# Altium footprint library smdComponent.PcbLib: 182 footprints (part 10 of 12)
Each footprint in its own frame and in the unit in brackets; x right, y up, seen from the top. Pads: shape width x height; smd on the part's side, far side on the other; paste and mask are expansions set on the pad; w line width, h text height; cw(c..) or ccw(c..) is an arc to the next point about the centre after c.
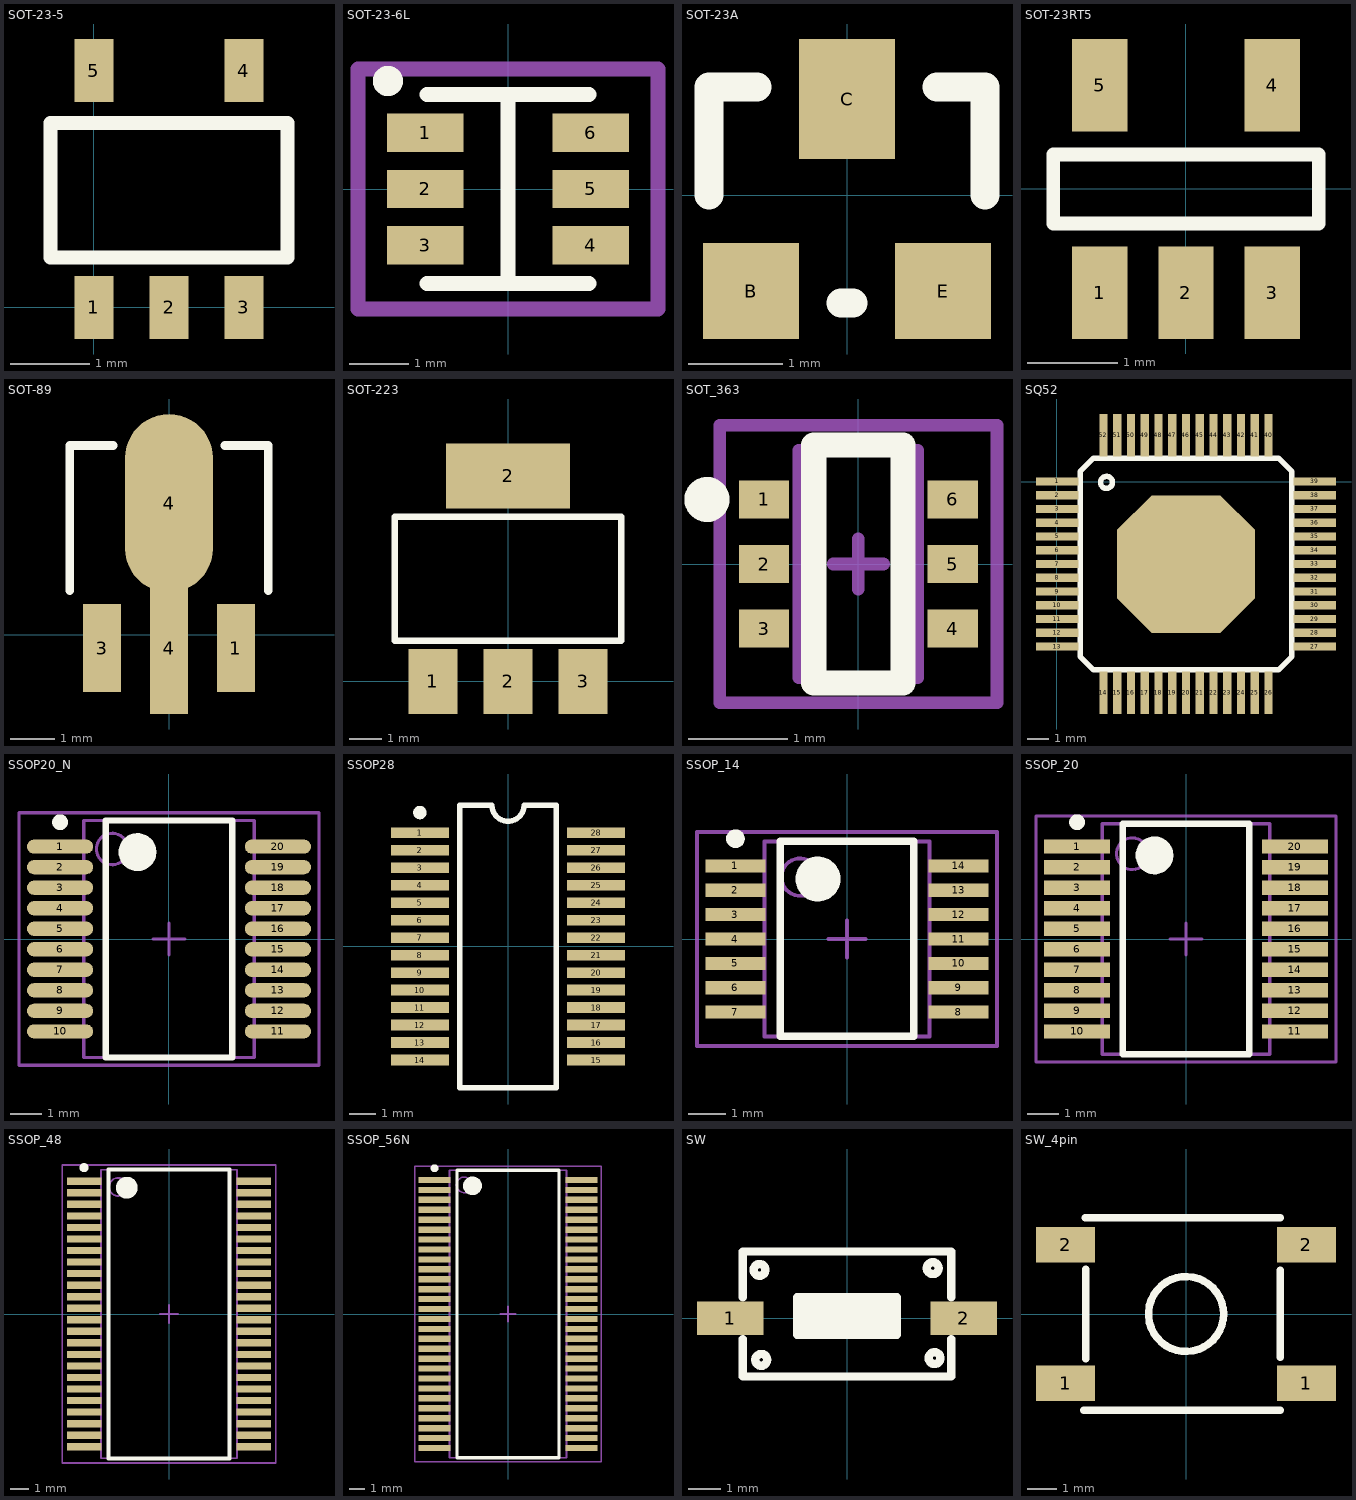
[diagram p9: the footprints below, top view; thin cyan lines are the x and y axes]

## SOT-23-5 [mm] "big num"
pads (5):
  rect 0.5x0.8 smd: 1(0,0) 2(0.95,0) 3(1.9,0) 4(1.9,3) 5(0,3)
Top Overlay:
  lines w0.178: -0.55,0.635 -0.55,2.335 2.45,2.335 2.45,0.635 -0.55,0.635

## SOT-23-6L [mm]
pads (6):
  rect 1.3x0.65 smd: 1(-1.4,0.95) 2(-1.4,0) 3(-1.4,-0.95) 4(1.4,-0.95) 5(1.4,0) 6(1.4,0.95)
Top Overlay:
  circle w0.254: c-2.032,1.829 r0.13
  lines w0.254: -1.372,-1.6 0,-1.6 ; -1.372,1.6 0,1.6 ; 1.372,-1.6 0,-1.6 ; 1.372,1.6 0,1.6 ; 0,-1.6 0,0 0,1.6
Mechanical 3:
  lines w0.254: -2.54,-2.032 2.54,-2.032 2.54,2.032 -2.54,2.032 -2.54,-2.032
3D body "SOT-23-6L.step": height 1.45, standoff 0, extent -1.4,-1.45 1.4,1.45

## SOT-23A [mil]
pads (3):
  rect 40x40 smd: B(-40,-40) E(40,-40)
  rect 40x50 smd: C(0,40)
Top Overlay:
  lines w12: -57.5,0 -57.5,45 -37.5,45 ; -2.5,-45 2.5,-45 ; 37.5,45 57.5,45 57.5,0
3D body "User Library-sot23-1_.STEP": height 39.97, standoff 0.6, extent -56.48,-46.06 58.49,46.07

## SOT-23RT5 [mil]
pads (5):
  rect 24x40 smd: 1(-37.4,-45) 2(0,-45) 3(37.4,-45) 4(37.4,45) 5(-37.4,45)
Top Overlay:
  lines w6: -57.5,-15 57.5,-15 57.5,15 -57.5,15 -57.5,-15

## SOT-89 [mm]
pads (4):
  rect 0.864x2 smd: 1(1.524,-0.3) 3(-1.524,-0.3)
  rect 0.864x3 smd: 4(0,-0.3)
  oval 2x4.064 smd: 4(0,3)
Top Overlay:
  lines w0.203: -2.261,1.016 -2.261,4.318 -1.27,4.318 ; 1.27,4.318 2.261,4.318 2.261,1.016
3D body "SOT-89.step": height 1.51, standoff 0, extent -2.239,-0.296 2.261,4.004

## SOT-223 [mm]
height 1.75
pads (4):
  rect 1.5x2 smd: 1(-2.3,0) 2(0,0) 3(2.3,0)
  rect 3.8x2 smd: 2(0,6.3)
Top Overlay:
  lines w0.2: -3.474,1.248 -3.474,5.054 3.474,5.054 3.474,1.248 -3.474,1.248
3D body "User Library-SOT-223-2.STEP": height 1.82, standoff -0.08, extent -3.351,-0.388 3.349,6.816

## SOT_363 [mil] "SOT363, 6-Leads, Body 2.8x2.8mm (max), Pitch 0.65mm, IPC Medium Density"
height 39.37
pads (6):
  rect 20x15 smd: 1(-37.4,25.59) 2(-37.4,0) 3(-37.4,-25.59) 4(37.4,-25.59) 5(37.4,0) 6(37.4,25.59)
Top Overlay:
  circle w10: c-60.04,25.59 r3.94
  lines w10: -17.72,-47.24 -17.72,47.24 17.72,47.24 17.72,-47.24 -17.72,-47.24
Mechanical 13:
  lines w5: -23.62,-45 -23.62,45 23.62,45 23.62,-45 -23.62,-45
Mechanical 15:
  lines w5: -10,0 10,0 ; 0,-10 0,10 ; -55,-55 -55,55 55,55 55,-55 -55,-55
3D body: height 39.37, standoff 0, extent -23.62,-45 23.62,45

## SQ52 [mm]
height 4.57
pads (53):
  rect 2x0.38 smd: 1(0.029,0.001) 2(0.029,-0.649) 3(0.029,-1.299) 4(0.029,-1.949) 5(0.029,-2.599) 6(0.029,-3.249) 7(0.029,-3.899) 8(0.029,-4.549) 9(0.029,-5.199) 10(0.029,-5.849) 11(0.029,-6.499) 12(0.029,-7.149) 13(0.029,-7.799) 27(12.208,-7.799) 28(12.208,-7.149) 29(12.208,-6.499) 30(12.208,-5.849) 31(12.208,-5.199) 32(12.208,-4.549) 33(12.208,-3.899) 34(12.208,-3.249) 35(12.208,-2.599) 36(12.208,-1.949) 37(12.208,-1.299) 38(12.208,-0.649) 39(12.208,0.001)
  rect 0.38x2 smd: 14(2.218,-9.989) 15(2.868,-9.989) 16(3.519,-9.989) 17(4.169,-9.989) 18(4.819,-9.989) 19(5.469,-9.989) 20(6.119,-9.989) 21(6.769,-9.989) 22(7.419,-9.989) 23(8.069,-9.989) 24(8.719,-9.989) 25(9.369,-9.989) 26(10.019,-9.989) 40(10.018,2.191) 41(9.368,2.191) 42(8.718,2.191) 43(8.068,2.191) 44(7.418,2.191) 45(6.768,2.191) 46(6.118,2.191) 47(5.468,2.191) 48(4.818,2.191) 49(4.168,2.191) 50(3.518,2.191) 51(2.868,2.191) 52(2.218,2.191)
  oct 6.5x6.5 smd: ""(6.118,-3.905)
Top Overlay:
  circle w0.254: c2.359,-0.042 r0.284
  lines w0.254: 1.118,-8.264 1.118,0.466 1.753,1.101 10.483,1.101 11.118,0.466 11.118,-8.264 10.483,-8.899 1.753,-8.899 1.118,-8.264

## SSOP20_N [mm]
pads (20):
  oval 2.1x0.45 smd: 1(-3.45,2.925) 2(-3.45,2.275) 3(-3.45,1.625) 4(-3.45,0.975) 5(-3.45,0.325) 6(-3.45,-0.325) 7(-3.45,-0.975) 8(-3.45,-1.625) 9(-3.45,-2.275) 10(-3.45,-2.925) 11(3.45,-2.925) 12(3.45,-2.275) 13(3.45,-1.625) 14(3.45,-0.975) 15(3.45,-0.325) 16(3.45,0.325) 17(3.45,0.975) 18(3.45,1.625) 19(3.45,2.275) 20(3.45,2.925)
Top Overlay:
  circle w0.6: c-1,2.75 r0.3
  circle w0.25: c-3.45,3.7 r0.125
  lines w0.2: -2,-3.75 2,-3.75 2,3.75 -2,3.75 -2,-3.75
Mechanical 13:
  circle w0.1: c-1.8,2.85 r0.5
  lines w0.1: -2.7,-3.75 2.7,-3.75 2.7,3.75 -2.7,3.75 -2.7,-3.75
Mechanical 15:
  lines w0.1: -0.5,0 0.5,0 ; 0,-0.5 0,0.5 ; -4.75,-4 4.75,-4 4.75,4 -4.75,4 -4.75,-4
3D body: height 1.99, standoff 0, extent -2.699,-3.749 2.699,3.749
3D body: height 1.99, standoff 0, extent -2.7,-3.75 2.7,3.75

## SSOP28 [mm]
pads (28):
  rect 2.15x0.4 smd: 1(-3.275,4.225) 2(-3.275,3.575) 3(-3.275,2.925) 4(-3.275,2.275) 5(-3.275,1.625) 6(-3.275,0.975) 7(-3.275,0.325) 8(-3.275,-0.325) 9(-3.275,-0.975) 10(-3.275,-1.625) 11(-3.275,-2.275) 12(-3.275,-2.925) 13(-3.275,-3.575) 14(-3.275,-4.225) 15(3.275,-4.225) 16(3.275,-3.575) 17(3.275,-2.925) 18(3.275,-2.275) 19(3.275,-1.625) 20(3.275,-0.975) 21(3.275,-0.325) 22(3.275,0.325) 23(3.275,0.975) 24(3.275,1.625) 25(3.275,2.275) 26(3.275,2.925) 27(3.275,3.575) 28(3.275,4.225)
Top Overlay:
  circle w0.25: c-3.275,4.975 r0.125
  lines w0.2: -1.8,-5.25 1.8,-5.25 1.8,5.25 0.6,5.25 cw(c0,5.25) -0.6,5.25 -1.8,5.25 -1.8,-5.25

## SSOP_14 [mm] "SSOP, 14-Leads, Body 5.2x4.4mm (max), Pitch 0.65mm, IPC Medium Density"
height 1.2
pads (14):
  rect 1.6x0.35 smd: 1(-2.975,1.95) 2(-2.975,1.3) 3(-2.975,0.65) 4(-2.975,0) 5(-2.975,-0.65) 6(-2.975,-1.3) 7(-2.975,-1.95) 8(2.975,-1.95) 9(2.975,-1.3) 10(2.975,-0.65) 11(2.975,0) 12(2.975,0.65) 13(2.975,1.3) 14(2.975,1.95)
Top Overlay:
  circle w0.6: c-0.775,1.6 r0.3
  circle w0.25: c-2.975,2.675 r0.125
  lines w0.2: -1.775,-2.6 1.775,-2.6 1.775,2.6 -1.775,2.6 -1.775,-2.6
Mechanical 13:
  circle w0.1: c-1.25,1.65 r0.5
  lines w0.1: -2.2,-2.6 2.2,-2.6 2.2,2.6 -2.2,2.6 -2.2,-2.6
Mechanical 15:
  lines w0.1: -0.5,0 0.5,0 ; 0,-0.5 0,0.5 ; -4,-2.85 4,-2.85 4,2.85 -4,2.85 -4,-2.85
3D body: height 1.2, standoff 0.1, extent -2.2,-2.6 2.2,2.6

## SSOP_20 [mm] "SOP, 20-Leads, Body 7.3x5.3mm (max), Pitch 0.65mm, IPC Medium Density"
height 2
pads (20):
  rect 2.1x0.45 smd: 1(-3.45,2.925) 2(-3.45,2.275) 3(-3.45,1.625) 4(-3.45,0.975) 5(-3.45,0.325) 6(-3.45,-0.325) 7(-3.45,-0.975) 8(-3.45,-1.625) 9(-3.45,-2.275) 10(-3.45,-2.925) 11(3.45,-2.925) 12(3.45,-2.275) 13(3.45,-1.625) 14(3.45,-0.975) 15(3.45,-0.325) 16(3.45,0.325) 17(3.45,0.975) 18(3.45,1.625) 19(3.45,2.275) 20(3.45,2.925)
Top Overlay:
  circle w0.6: c-1,2.65 r0.3
  circle w0.25: c-3.45,3.7 r0.125
  lines w0.2: -2,-3.65 2,-3.65 2,3.65 -2,3.65 -2,-3.65
Mechanical 13:
  circle w0.1: c-1.7,2.7 r0.5
  lines w0.1: -2.65,-3.65 2.65,-3.65 2.65,3.65 -2.65,3.65 -2.65,-3.65
Mechanical 15:
  lines w0.1: -0.5,0 0.5,0 ; 0,-0.5 0,0.5 ; -4.75,-3.9 4.75,-3.9 4.75,3.9 -4.75,3.9 -4.75,-3.9
3D body "User Library-TSSOP-20-1.STEP": height 1, standoff 0, extent -3.23,-3.251 3.179,3.249

## SSOP_48 [mm] "SSOP, 48-Leads, Body 15.9x7.5mm (max), Pitch 0.63mm, IPC Medium Density"
height 2.54
pads (48):
  rect 1.9x0.4 smd: 1(-4.675,7.302) 2(-4.675,6.667) 3(-4.675,6.032) 4(-4.675,5.397) 5(-4.675,4.763) 6(-4.675,4.127) 7(-4.675,3.492) 8(-4.675,2.857) 9(-4.675,2.222) 10(-4.675,1.587) 11(-4.675,0.953) 12(-4.675,0.318) 13(-4.675,-0.318) 14(-4.675,-0.953) 15(-4.675,-1.587) 16(-4.675,-2.222) 17(-4.675,-2.857) 18(-4.675,-3.492) 19(-4.675,-4.127) 20(-4.675,-4.763) 21(-4.675,-5.397) 22(-4.675,-6.032) 23(-4.675,-6.667) 24(-4.675,-7.302) 25(4.675,-7.302) 26(4.675,-6.667) 27(4.675,-6.032) 28(4.675,-5.397) 29(4.675,-4.763) 30(4.675,-4.127) 31(4.675,-3.492) 32(4.675,-2.857) 33(4.675,-2.222) 34(4.675,-1.587) 35(4.675,-0.953) 36(4.675,-0.318) 37(4.675,0.318) 38(4.675,0.953) 39(4.675,1.587) 40(4.675,2.222) 41(4.675,2.857) 42(4.675,3.492) 43(4.675,4.127) 44(4.675,4.763) 45(4.675,5.397) 46(4.675,6.032) 47(4.675,6.667) 48(4.675,7.302)
Top Overlay:
  circle w0.6: c-2.325,6.95 r0.3
  circle w0.25: c-4.675,8.053 r0.125
  lines w0.2: -3.325,-7.95 3.325,-7.95 3.325,7.95 -3.325,7.95 -3.325,-7.95
Mechanical 13:
  circle w0.1: c-2.795,6.99 r0.5
  lines w0.1: -3.745,-7.94 3.745,-7.94 3.745,7.94 -3.745,7.94 -3.745,-7.94
Mechanical 15:
  lines w0.1: -0.5,0 0.5,0 ; 0,-0.5 0,0.5 ; -5.875,-8.2 5.875,-8.2 5.875,8.2 -5.875,8.2 -5.875,-8.2
3D body: height 2.54, standoff 0.3, extent -3.745,-7.94 3.745,7.94

## SSOP_56N [mm] "SSOP, 56-Leads, Body 18.4x7.5mm (max), Pitch 0.63mm, IPC Medium Density"
height 2.54
pads (56):
  rect 2.05x0.4 smd: 1(-4.7,8.572) 2(-4.7,7.938) 3(-4.7,7.302) 4(-4.7,6.667) 5(-4.7,6.032) 6(-4.7,5.397) 7(-4.7,4.763) 8(-4.7,4.127) 9(-4.7,3.492) 10(-4.7,2.857) 11(-4.7,2.222) 12(-4.7,1.587) 13(-4.7,0.953) 14(-4.7,0.318) 15(-4.7,-0.318) 16(-4.7,-0.953) 17(-4.7,-1.587) 18(-4.7,-2.222) 19(-4.7,-2.857) 20(-4.7,-3.492) 21(-4.7,-4.127) 22(-4.7,-4.763) 23(-4.7,-5.397) 24(-4.7,-6.032) 25(-4.7,-6.667) 26(-4.7,-7.302) 27(-4.7,-7.938) 28(-4.7,-8.572) 29(4.7,-8.572) 30(4.7,-7.938) 31(4.7,-7.302) 32(4.7,-6.667) 33(4.7,-6.032) 34(4.7,-5.397) 35(4.7,-4.763) 36(4.7,-4.127) 37(4.7,-3.492) 38(4.7,-2.857) 39(4.7,-2.222) 40(4.7,-1.587) 41(4.7,-0.953) 42(4.7,-0.318) 43(4.7,0.318) 44(4.7,0.953) 45(4.7,1.587) 46(4.7,2.222) 47(4.7,2.857) 48(4.7,3.492) 49(4.7,4.127) 50(4.7,4.763) 51(4.7,5.397) 52(4.7,6.032) 53(4.7,6.667) 54(4.7,7.302) 55(4.7,7.938) 56(4.7,8.572)
Top Overlay:
  circle w0.6: c-2.275,8.2 r0.3
  circle w0.25: c-4.7,9.323 r0.125
  lines w0.2: -3.275,-9.2 3.275,-9.2 3.275,9.2 -3.275,9.2 -3.275,-9.2
Mechanical 13:
  circle w0.1: c-2.795,8.26 r0.5
  lines w0.1: -3.745,-9.21 3.745,-9.21 3.745,9.21 -3.745,9.21 -3.745,-9.21
Mechanical 15:
  lines w0.1: -0.5,0 0.5,0 ; 0,-0.5 0,0.5 ; -5.975,-9.45 5.975,-9.45 5.975,9.45 -5.975,9.45 -5.975,-9.45
3D body: height 2.54, standoff 0.3, extent -3.745,-9.21 3.745,9.21

## SW [mil]
height 62.99
pads (2):
  rect 80x40 smd: 1(-140,0) 2(140,0)
Top Overlay:
  circle w10: c102.93,60 r7.07
  circle w10: c-105,57.93 r7.07
  circle w10: c-102.93,-50 r7.07
  circle w10: c105,-47.93 r7.07
  rectangle: -60,-20 60,25
  lines w10: -125,-25 -125,-70 125,-70 125,-25 ; -125,25 -125,80 125,80 125,25 ; -60,-20 -60,25 60,25 60,-20 -60,-20
3D body "Switch.STEP": height 75.41, standoff 0.6, extent -168.19,-69.06 168.2,79.36

## SW_4pin [mm]
pads (4):
  rect 2x1.2 smd: 1(-4.077,-2.349) 1(4.077,-2.349) 2(-4.077,2.349) 2(4.077,2.349)
Top Overlay:
  circle w0.254: c0,0 r1.27
  lines w0.254: -3.467,-3.264 3.188,-3.264 ; -3.416,3.264 3.188,3.264 ; -3.391,-1.511 -3.391,1.511 ; 3.188,-1.46 3.188,1.486
3D body "KFC-A06-HA-4_3.STEP": height 4.3, standoff 0, extent -4.551,-2.977 4.449,3.023